# Altium footprint library 13-IC Packages-3pic1.PcbLib: 49 footprints (part 3 of 4)
Each footprint in its own frame and in the unit in brackets; x right, y up, seen from the top. Pads: shape width x height; smd on the part's side, far side on the other; paste and mask are expansions set on the pad; w line width, h text height; cw(c..) or ccw(c..) is an arc to the next point about the centre after c.
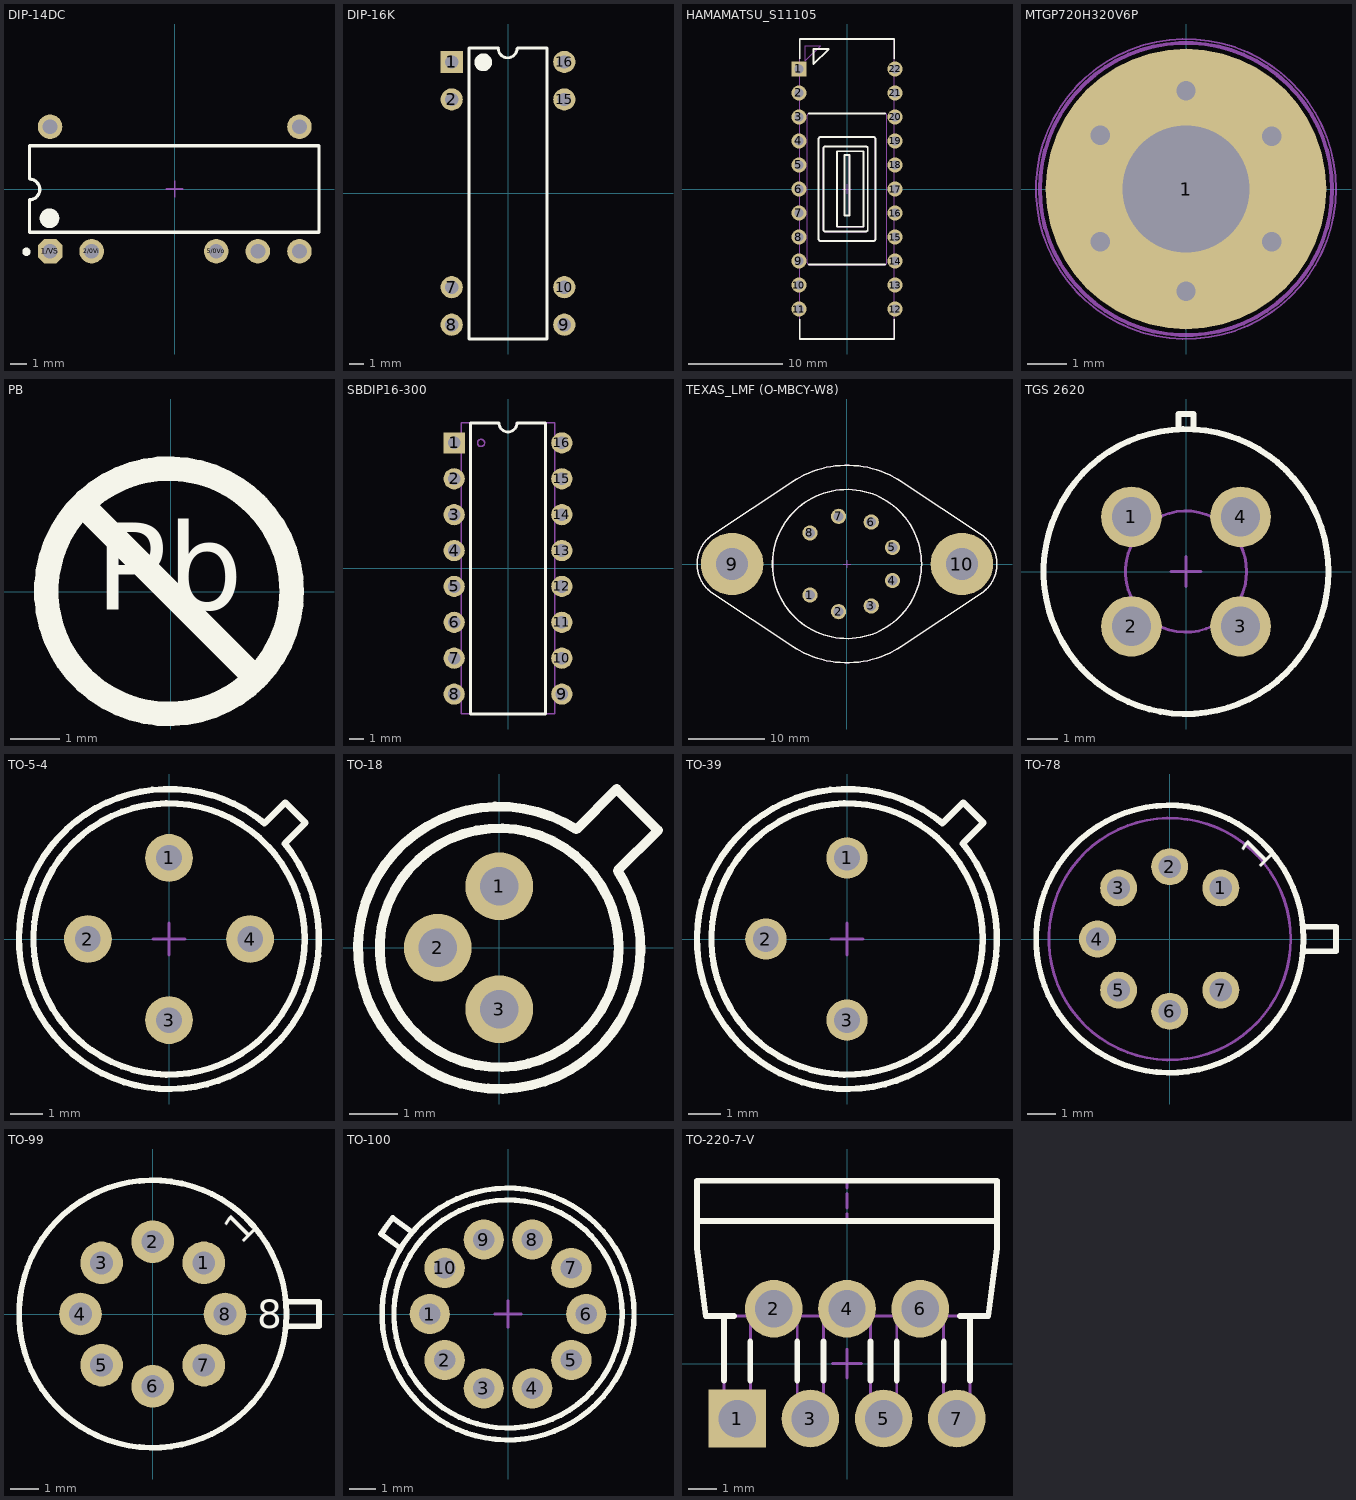
[diagram p2: the footprints below, top view; thin cyan lines are the x and y axes]

## DIP-14DC [mm]
height 5.08
pads (7):
  oct 1.5x1.5 hole 0.9 mask+0.07: 1/VS(-7.62,-3.81)
  round 1.5 hole 0.9: 2/0Vi(-5.08,-3.81)
  round 1.5 hole 0.9 mask+0.07: 5/0Vo(2.54,-3.81) 6/+Vout(5.08,-3.81) 7/-Vout/nc(7.62,-3.81) 8/SYNCout(7.62,3.81) 14/SYNCin(-7.62,3.81)
Top Overlay:
  circle w0.25: c-9.066,-3.835 r0.125
  circle w0.6: c-7.653,-1.791 r0.3
  lines w0.2: -8.881,-2.65 -8.881,-0.66 ccw(c-8.881,-0.025) -8.881,0.61 -8.881,2.625 -8.855,2.65 8.814,2.65 8.814,-2.65 -8.881,-2.65
Mechanical 15:
  lines w0.1: -0.5,0 0.5,0 ; 0,-0.5 0,0.5
3D body "dip-14K.stp": height 4.45, standoff -1.71, extent -8.661,-3.95 8.533,3.92
3D body "0_9-1_5-1_1.stp": height 0.05, standoff -1.05, extent -8.371,-4.572 -6.871,-3.072
3D body "0_9-1_5-1_1.stp": height 0.05, standoff -1.05, extent -5.831,-4.572 -4.331,-3.072
3D body "0_9-1_5-1_1.stp": height 0.05, standoff -1.05, extent 1.789,-4.572 3.289,-3.072
3D body "0_9-1_5-1_1.stp": height 0.05, standoff -1.05, extent 4.329,-4.572 5.829,-3.072
3D body "0_9-1_5-1_1.stp": height 0.05, standoff -1.05, extent 6.869,-4.572 8.369,-3.072
3D body "0_9-1_5-1_1.stp": height 0.05, standoff -1.05, extent 6.869,3.048 8.369,4.548
3D body "0_9-1_5-1_1.stp": height 0.05, standoff -1.05, extent -8.371,3.048 -6.871,4.548

## DIP-16K [mm]
height 5.08
pads (8):
  rect 1.5x1.5 hole 0.9: 1(-3.81,8.89)
  round 1.5 hole 0.9 mask+0.07: 2(-3.81,6.35) 7(-3.81,-6.35) 8(-3.81,-8.89) 9(3.81,-8.89) 10(3.81,-6.35) 15(3.81,6.35) 16(3.81,8.89)
Top Overlay:
  circle w0.6: c-1.672,8.865 r0.3
  lines w0.2: -0.66,9.804 ccw(c-0.025,9.804) 0.61,9.804 ; -0.635,9.83 -2.65,9.83 -2.65,-9.855 2.65,-9.855 2.65,9.83 0.635,9.83
3D body "dip-16K.stp": height 4.45, standoff -1.71, extent -3.935,-9.843 3.935,9.842
3D body "0_9-1_5-1_1.stp": height 0.05, standoff -1.05, extent -4.559,5.601 -3.059,7.101
3D body "0_9-1_5-1_1.stp": height 0.05, standoff -1.05, extent -4.572,8.141 -3.072,9.641
3D body "0_9-1_5-1_1.stp": height 0.05, standoff -1.05, extent -4.572,-7.099 -3.072,-5.599
3D body "0_9-1_5-1_1.stp": height 0.05, standoff -1.05, extent -4.572,-9.639 -3.072,-8.139
3D body "0_9-1_5-1_1.stp": height 0.05, standoff -1.05, extent 3.048,-9.639 4.548,-8.139
3D body "0_9-1_5-1_1.stp": height 0.05, standoff -1.05, extent 3.035,-7.099 4.535,-5.599
3D body "0_9-1_5-1_1.stp": height 0.05, standoff -1.05, extent 3.061,5.601 4.561,7.101
3D body "0_9-1_5-1_1.stp": height 0.05, standoff -1.05, extent 3.061,8.153 4.561,9.653

## HAMAMATSU_S11105 [mm] "22 Leads Dual In-Line Package, Row Spacing 10.16mm; Pitch 2.54mm"
height 4
pads (22):
  rect 1.6x1.6 hole 0.9: 1(-5.08,12.7)
  round 1.6 hole 0.9: 2(-5.08,10.16) 3(-5.08,7.62) 4(-5.08,5.08) 5(-5.08,2.54) 6(-5.08,0) 7(-5.08,-2.54) 8(-5.08,-5.08) 9(-5.08,-7.62) 10(-5.08,-10.16) 11(-5.08,-12.7) 12(5.08,-12.7) 13(5.08,-10.16) 14(5.08,-7.62) 15(5.08,-5.08) 16(5.08,-2.54) 17(5.08,0) 18(5.08,2.54) 19(5.08,5.08) 20(5.08,7.62) 21(5.08,10.16) 22(5.08,12.7)
Top Overlay:
  lines w0.2: -5,-13.797 -5,-15.875 5,-15.875 5,-13.797 ; -5,13.797 -5,15.875 5,15.875 5,13.797 ; -4.046,-7.995 ccw(c-4,-7.8) -4,-8 4,-8 ccw(c4,-7.8) 4.046,-7.995 ; -4.046,7.995 cw(c-4,7.8) -4,8 4,8 cw(c4,7.8) 4.046,7.995 ; -3.55,13.2 -3.55,14.8 -1.95,14.8 -3.55,13.2 ; -3,-5.3 ccw(c-2.8,-5.3) -2.8,-5.5 2.8,-5.5 ccw(c2.8,-5.3) 3,-5.3 3,5.3 ccw(c2.8,5.3) 2.8,5.5 -2.8,5.5 ccw(c-2.8,5.3) -3,5.3 -3,-5.3 ; -2.5,-4.3 ccw(c-2.3,-4.3) -2.3,-4.5 2,-4.5 ccw(c2,-4.3) 2.2,-4.3 2.2,4.3 ccw(c2,4.3) 2,4.5 -2.3,4.5 ccw(c-2.3,4.3) -2.5,4.3 -2.5,-4.3 ; -1.05,-4 -1.05,4 1.75,4 1.75,-4 -1.05,-4 ; -0.25,-2.8 -0.25,3.6 0.25,3.6 0.25,-2.8 -0.25,-2.8
Mechanical 8:
  lines w0.1: -5.58,-12.7 -5.08,-12.7 ; -5.58,-10.16 -5.08,-10.16 ; -5.58,-7.62 -5.08,-7.62 ; -5.58,-5.08 -5.08,-5.08 ; -5.58,-2.54 -5.08,-2.54 ; -5.58,0 -5.08,0 ; -5.58,2.54 -5.08,2.54 ; -5.58,5.08 -5.08,5.08 ; -5.58,7.62 -5.08,7.62 ; -5.58,10.16 -5.08,10.16 ; -5.58,12.7 -5.08,12.7 ; -5.08,-13.2 -5.08,-12.7 ; -5.08,-12.2 -5.08,-12.7 ; -5.08,-10.66 -5.08,-10.16 ; -5.08,-9.66 -5.08,-10.16 ; -5.08,-8.12 -5.08,-7.62 ; -5.08,-7.12 -5.08,-7.62 ; -5.08,-5.58 -5.08,-5.08 ; -5.08,-4.58 -5.08,-5.08 ; -5.08,-3.04 -5.08,-2.54 ; -5.08,-2.04 -5.08,-2.54 ; -5.08,-0.5 -5.08,0 ; -5.08,0.5 -5.08,0 ; -5.08,2.04 -5.08,2.54 ; -5.08,3.04 -5.08,2.54 ; -5.08,4.58 -5.08,5.08 ; -5.08,5.58 -5.08,5.08 ; -5.08,7.12 -5.08,7.62 ; -5.08,8.12 -5.08,7.62 ; -5.08,9.66 -5.08,10.16 ; -5.08,10.66 -5.08,10.16 ; -5.08,12.2 -5.08,12.7 ; -5.08,13.2 -5.08,12.7 ; -4.58,-12.7 -5.08,-12.7 ; -4.58,-10.16 -5.08,-10.16 ; -4.58,-7.62 -5.08,-7.62 ; -4.58,-5.08 -5.08,-5.08 ; -4.58,-2.54 -5.08,-2.54 ; -4.58,0 -5.08,0 ; -4.58,2.54 -5.08,2.54 ; -4.58,5.08 -5.08,5.08 ; -4.58,7.62 -5.08,7.62 ; -4.58,10.16 -5.08,10.16 ; -4.58,12.7 -5.08,12.7 ; -0.5,0 0,0 ; 0,-0.5 0,0 ; 0,0.5 0,0 ; 0.5,0 0,0 ; 4.58,-12.7 5.08,-12.7 ; 4.58,-10.16 5.08,-10.16 ; 4.58,-7.62 5.08,-7.62 ; 4.58,-5.08 5.08,-5.08 ; 4.58,-2.54 5.08,-2.54 ; 4.58,0 5.08,0 ; 4.58,2.54 5.08,2.54 ; 4.58,5.08 5.08,5.08 ; 4.58,7.62 5.08,7.62 ; 4.58,10.16 5.08,10.16 ; 4.58,12.7 5.08,12.7 ; 5.08,-13.2 5.08,-12.7 ; 5.08,-12.2 5.08,-12.7 ; 5.08,-10.66 5.08,-10.16 ; 5.08,-9.66 5.08,-10.16 ; 5.08,-8.12 5.08,-7.62 ; 5.08,-7.12 5.08,-7.62 ; 5.08,-5.58 5.08,-5.08 ; 5.08,-4.58 5.08,-5.08 ; 5.08,-3.04 5.08,-2.54 ; 5.08,-2.04 5.08,-2.54 ; 5.08,-0.5 5.08,0 ; 5.08,0.5 5.08,0 ; 5.08,2.04 5.08,2.54 ; 5.08,3.04 5.08,2.54 ; 5.08,4.58 5.08,5.08 ; 5.08,5.58 5.08,5.08 ; 5.08,7.12 5.08,7.62 ; 5.08,8.12 5.08,7.62 ; 5.08,9.66 5.08,10.16 ; 5.08,10.66 5.08,10.16 ; 5.08,12.2 5.08,12.7 ; 5.08,13.2 5.08,12.7 ; 5.58,-12.7 5.08,-12.7 ; 5.58,-10.16 5.08,-10.16 ; 5.58,-7.62 5.08,-7.62 ; 5.58,-5.08 5.08,-5.08 ; 5.58,-2.54 5.08,-2.54 ; 5.58,0 5.08,0 ; 5.58,2.54 5.08,2.54 ; 5.58,5.08 5.08,5.08 ; 5.58,7.62 5.08,7.62 ; 5.58,10.16 5.08,10.16 ; 5.58,12.7 5.08,12.7
Mechanical 14:
  lines w0.1: -5,-15.875 5,-15.875 5,15.875 -5,15.875 -5,-15.875 ; -4.4,13.575 -2.8,15.175 -4.4,15.175 -4.4,13.575 ; -4.2,-7.8 ccw(c-4,-7.8) -4,-8 4,-8 ccw(c4,-7.8) 4.2,-7.8 4.2,7.8 ccw(c4,7.8) 4,8 -4,8 ccw(c-4,7.8) -4.2,7.8 -4.2,-7.8 ; -3,-5.3 ccw(c-2.8,-5.3) -2.8,-5.5 2.8,-5.5 ccw(c2.8,-5.3) 3,-5.3 3,5.3 ccw(c2.8,5.3) 2.8,5.5 -2.8,5.5 ccw(c-2.8,5.3) -3,5.3 -3,-5.3 ; -2.5,-4.3 ccw(c-2.3,-4.3) -2.3,-4.5 2,-4.5 ccw(c2,-4.3) 2.2,-4.3 2.2,4.3 ccw(c2,4.3) 2,4.5 -2.3,4.5 ccw(c-2.3,4.3) -2.5,4.3 -2.5,-4.3 ; -1.05,-4 -1.05,4 1.75,4 1.75,-4 -1.05,-4 ; -0.25,-2.8 -0.25,3.6 0.25,3.6 0.25,-2.8 -0.25,-2.8
3D body "HAMAMATSU_S11105.stp": height 3, standoff -4.3, extent -5.205,-15.875 5.205,15.875

## MTGP720H320V6P [mm]
pads (1):
  round 7.2 hole 3.25: 1(0,0)
via -2.2,-1.35 diameter 1 hole 0.5
via -2.2,1.375 diameter 1 hole 0.5
via 0,2.525 diameter 1 hole 0.5
via 2.2,1.35 diameter 1 hole 0.5
via 0,-2.625 diameter 1 hole 0.5
via 2.2,-1.35 diameter 1 hole 0.5
Mechanical 8:
  circle w0.1: c0,0 r2.6
  circle w0.1: c0,0 r3.75
  lines w0.1: -2.657,1.625 -2.224,1.375 ; -2.632,-1.6 -2.199,-1.35 ; -2.474,0.942 -2.224,1.375 ; -2.449,-0.917 -2.199,-1.35 ; -1.974,1.808 -2.224,1.375 ; -1.949,-1.783 -2.199,-1.35 ; -1.791,1.125 -2.224,1.375 ; -1.766,-1.1 -2.199,-1.35 ; -0.5,-2.625 0,-2.625 ; -0.5,0 0,0 ; -0.5,2.525 0,2.525 ; 0,-3.125 0,-2.625 ; 0,-2.125 0,-2.625 ; 0,-0.5 0,0 ; 0,0.5 0,0 ; 0,2.025 0,2.525 ; 0,3.025 0,2.525 ; 0.5,-2.625 0,-2.625 ; 0.5,0 0,0 ; 0.5,2.525 0,2.525 ; 1.766,-1.1 2.199,-1.35 ; 1.766,1.1 2.199,1.35 ; 1.949,-1.783 2.199,-1.35 ; 1.949,1.783 2.199,1.35 ; 2.449,-0.917 2.199,-1.35 ; 2.449,0.917 2.199,1.35 ; 2.632,-1.6 2.199,-1.35 ; 2.632,1.6 2.199,1.35
Mechanical 14:
  circle w0.1: c0,0 r3.75
Mechanical 15:
  circle w0.05: c0,0 r3.85
3D body "mtgp720h320v6p.stp": height 0.1, standoff -1.75, extent -3.627,-3.627 3.628,3.628

## PB [mm]
Top Overlay:
  circle w0.5: c-0.031,0.013 r2.5
  lines w0.5: -1.737,1.719 1.675,-1.693
  text "Pb" at -1.536,-0.948 h3.05
3D body "pb.stp": height 0.02, standoff 0, extent -2.725,-2.725 2.725,2.725

## PCBComponent_1 - duplicate [mm]

## SBDIP16-300 [mm] "Side-Brazed Ceramic Dual In-Line Package (SBDIP) 16 Leads, Row Spacing 7.62 mm; Pitch 2.54 mm"
height 4.45
pads (16):
  rect 1.5x1.5 hole 0.9: 1(-3.81,8.89)
  round 1.5 hole 0.9: 2(-3.81,6.35) 3(-3.81,3.81) 4(-3.81,1.27) 5(-3.81,-1.27) 6(-3.81,-3.81) 7(-3.81,-6.35) 8(-3.81,-8.89) 9(3.81,-8.89) 10(3.81,-6.35) 11(3.81,-3.81) 12(3.81,-1.27) 13(3.81,1.27) 14(3.81,3.81) 15(3.81,6.35) 16(3.81,8.89)
Top Overlay:
  lines w0.2: -2.65,-10.3 -2.65,10.3 -0.635,10.3 ccw(c0,10.3) 0.635,10.3 2.65,10.3 2.65,-10.3 -2.65,-10.3
Mechanical 14:
  circle w0.1: c-1.905,8.89 r0.254
  lines w0.1: -3.3,-10.3 3.3,-10.3 3.3,10.3 0.6,10.3 cw(c-0.035,10.3) -0.67,10.3 -3.3,10.3 -3.3,-10.3
3D body "SBDIP16-300.stp": height 4.55, standoff -3.81, extent -4.125,-10.285 4.125,10.285

## TEXAS_LMF (O-MBCY-W8) [mm] "TO-3 8 Pins, Texas LMF (O-MBCY-W8) Case"
height 7.62
pads (10):
  round 2 hole 1.3: 1(-4.864,-4.082) 2(-1.103,-6.254) 3(3.175,-5.499) 4(5.967,-2.172) 5(5.967,2.172) 6(3.175,5.499) 7(-1.103,6.254) 8(-4.864,4.082)
  round 8.2 hole 4.2: 9(-15.075,0) 10(15.075,0)
Top Overlay:
  circle w0.2: c0,0 r9.78
  lines w0.2: -17.627,-3.839 cw(c-15.075,0) -17.627,3.839 -7.171,10.789 cw(c0,0) 7.171,10.789 17.627,3.839 cw(c15.075,0) 17.627,-3.839 7.171,-10.789 cw(c0,0) -7.171,-10.789 -17.627,-3.839
Mechanical 8:
  lines w0.1: -15.575,0 -15.075,0 ; -15.075,-0.5 -15.075,0 ; -15.075,0.5 -15.075,0 ; -14.575,0 -15.075,0 ; -5.247,-4.403 -4.864,-4.082 ; -5.247,4.403 -4.864,4.082 ; -5.186,-3.699 -4.864,-4.082 ; -5.186,3.699 -4.864,4.082 ; -4.543,-4.465 -4.864,-4.082 ; -4.543,4.465 -4.864,4.082 ; -4.481,-3.76 -4.864,-4.082 ; -4.481,3.76 -4.864,4.082 ; -1.595,-6.167 -1.103,-6.254 ; -1.595,6.167 -1.103,6.254 ; -1.189,-6.746 -1.103,-6.254 ; -1.189,6.746 -1.103,6.254 ; -1.016,-5.761 -1.103,-6.254 ; -1.016,5.761 -1.103,6.254 ; -0.61,-6.34 -1.103,-6.254 ; -0.61,6.34 -1.103,6.254 ; -0.5,0 0,0 ; 0,-0.5 0,0 ; 0,0.5 0,0 ; 0.5,0 0,0 ; 2.742,-5.749 3.175,-5.499 ; 2.742,5.749 3.175,5.499 ; 2.925,-5.066 3.175,-5.499 ; 2.925,5.066 3.175,5.499 ; 3.425,-5.932 3.175,-5.499 ; 3.425,5.932 3.175,5.499 ; 3.608,-5.249 3.175,-5.499 ; 3.608,5.249 3.175,5.499 ; 5.497,-2.001 5.967,-2.172 ; 5.497,2.001 5.967,2.172 ; 5.796,-2.642 5.967,-2.172 ; 5.796,2.642 5.967,2.172 ; 6.138,-1.702 5.967,-2.172 ; 6.138,1.702 5.967,2.172 ; 6.437,-2.343 5.967,-2.172 ; 6.437,2.343 5.967,2.172 ; 14.575,0 15.075,0 ; 15.075,-0.5 15.075,0 ; 15.075,0.5 15.075,0 ; 15.575,0 15.075,0
Mechanical 14:
  circle w0.1: c0,0 r9.78
  circle w0.1: c15.075,0 r1.95
  circle w0.1: c-15.075,0 r1.95
  lines w0.1: -17.627,-3.839 cw(c-15.075,0) -17.627,3.839 -7.171,10.789 cw(c0,0) 7.171,10.789 17.627,3.839 cw(c15.075,0) 17.627,-3.839 7.171,-10.789 cw(c0,0) -7.171,-10.789 -17.627,-3.839
3D body "TEXAS_LMF (O–MBCY–W8).stp": height 7.62, standoff -6, extent -19.685,-12.955 19.685,12.955

## TGS 2620 [mm] "4 Leads Solvent Vapors Sensor, Body Dia. 9.2mm, Body Height 7.8mm, Lead Spacing Diameter 5.1mm"
height 8.3
pads (4):
  round 2 hole 1.3: 1(-1.8,1.806) 2(-1.8,-1.806) 3(1.8,-1.806) 4(1.8,1.806)
Top Overlay:
  circle w0.2: c0,0 r4.7
  lines w0.2: -0.25,4.693 -0.25,5.2 0.25,5.2 0.25,4.693
Mechanical 8:
  lines w0.1: -2.3,-1.806 -1.8,-1.806 ; -2.3,1.806 -1.8,1.806 ; -1.8,-2.306 -1.8,-1.806 ; -1.8,-1.306 -1.8,-1.806 ; -1.8,1.306 -1.8,1.806 ; -1.8,2.306 -1.8,1.806 ; -1.3,-1.806 -1.8,-1.806 ; -1.3,1.806 -1.8,1.806 ; -0.5,0 0,0 ; 0,-0.5 0,0 ; 0,0.5 0,0 ; 0.5,0 0,0 ; 1.3,-1.806 1.8,-1.806 ; 1.3,1.806 1.8,1.806 ; 1.8,-2.306 1.8,-1.806 ; 1.8,-1.306 1.8,-1.806 ; 1.8,1.306 1.8,1.806 ; 1.8,2.306 1.8,1.806 ; 2.3,-1.806 1.8,-1.806 ; 2.3,1.806 1.8,1.806
Mechanical 14:
  circle w0.1: c0,0 r4.7
  circle w0.1: c0,0 r2
  lines w0.1: -0.25,4.693 -0.25,5.2 0.25,5.2 0.25,4.693
3D body "TGS 2620.stp": height 9.3, standoff -3.6, extent -4.7,-4.7 4.7,5.2

## TO-5-4 [mm] "TO-5, 4 Leads"
height 11.25
pads (4):
  round 1.5 hole 0.8: 1(0,2.54) 2(-2.54,0) 3(0,-2.54) 4(2.54,0)
Top Overlay:
  circle w0.2: c0,0 r4.25
  lines w0.2: 2.99,3.626 ccw(c0,0) 3.626,2.99 4.278,3.642 3.642,4.278 2.99,3.626
Mechanical 8:
  lines w0.1: -3.04,0 -2.54,0 ; -2.54,-0.5 -2.54,0 ; -2.54,0.5 -2.54,0 ; -2.04,0 -2.54,0 ; -0.5,-2.54 0,-2.54 ; -0.5,0 0,0 ; -0.5,2.54 0,2.54 ; 0,-3.04 0,-2.54 ; 0,-2.04 0,-2.54 ; 0,-0.5 0,0 ; 0,0.5 0,0 ; 0,2.04 0,2.54 ; 0,3.04 0,2.54 ; 0.5,-2.54 0,-2.54 ; 0.5,0 0,0 ; 0.5,2.54 0,2.54
Mechanical 14:
  circle w0.1: c0,0 r4.25
  lines w0.1: 2.99,3.626 ccw(c0,0) 3.626,2.99 4.278,3.642 3.642,4.278 2.99,3.626
3D body "TO-5-3.stp": height 11.25, standoff -3.65, extent -4.7,-4.7 4.7,4.7

## TO-18 [mm] "TO-18  3 Leads, Pitch 2.54mm, Body Dia. 5.84mm, Leads Dia. 0.5mm"
height 10.13
pads (3):
  round 1.4 hole 0.8: 1(0,1.27) 2(-1.27,0) 3(0,-1.27)
Top Overlay:
  circle w0.2: c0,0 r2.47
  lines w0.2: 1.593,2.447 ccw(c0,0) 2.447,1.593 3.282,2.428 2.428,3.282 1.593,2.447
Mechanical 14:
  circle w0.1: c0,0 r2.47
  lines w0.1: 1.593,2.447 ccw(c0,0) 2.447,1.593 3.282,2.428 2.428,3.282 1.593,2.447
3D body "TO-18.stp": height 10.13, standoff -3.6, extent -2.92,-2.92 3.282,3.282

## TO-39 [mm] "TO-39  3 Leads, Pitch 2.54mm, Body Dia. 9.4mm, Leads Dia. 0.5mm"
height 6.6
pads (3):
  round 1.3 hole 0.8: 1(0,2.54) 2(-2.54,0) 3(0,-2.54)
Top Overlay:
  circle w0.2: c0,0 r4.25
  lines w0.2: 2.99,3.626 ccw(c0,0) 3.626,2.99 4.278,3.642 3.642,4.278 2.99,3.626
Mechanical 8:
  lines w0.1: -3.04,0 -2.54,0 ; -2.54,-0.5 -2.54,0 ; -2.54,0.5 -2.54,0 ; -2.04,0 -2.54,0 ; -0.5,-2.54 0,-2.54 ; -0.5,0 0,0 ; -0.5,2.54 0,2.54 ; 0,-3.04 0,-2.54 ; 0,-2.04 0,-2.54 ; 0,-0.5 0,0 ; 0,0.5 0,0 ; 0,2.04 0,2.54 ; 0,3.04 0,2.54 ; 0.5,-2.54 0,-2.54 ; 0.5,0 0,0 ; 0.5,2.54 0,2.54
Mechanical 14:
  circle w0.1: c0,0 r4.25
  lines w0.1: 2.99,3.626 ccw(c0,0) 3.626,2.99 4.278,3.642 3.642,4.278 2.99,3.626
3D body "TO-39.stp": height 11.25, standoff -3.65, extent -4.7,-4.7 4.7,4.7

## TO-78 [mm] "TO-78 7 Leads, Body Dia. 9.4mm (max), Lead Diameter 5.08mm"
height 4.7
pads (7):
  round 1.3 hole 0.8: 1(1.796,1.796) 2(0,2.54) 3(-1.796,1.796) 4(-2.54,0) 5(-1.796,-1.796) 6(0,-2.54) 7(1.796,-1.796)
Top Overlay:
  circle w0.2: c0,0 r4.699
  lines w0.2: 4.679,-0.432 5.842,-0.432 5.842,0.432 4.679,0.432
  text "1" at 3.098,2.391 h1
Mechanical 8:
  text "2" at 0.5,3.667 h1
  text "3" at -2.239,2.946 h1
  text "4" at -3.643,0.5 h1
  text "5" at -2.946,-2.239 h1
  text "6" at -0.5,-3.69 h1
  text "7" at 2.239,-2.946 h1
Mechanical 14:
  circle w0.1: c0,0 r4.699
  circle w0.1: c0,0 r4.25
  lines w0.1: 4.679,-0.432 5.842,-0.432 5.842,0.432 4.679,0.432
  text "1" at 3.098,2.391 h1
3D body "TO-78.stp": height 4.7, standoff -3.6, extent -4.695,-4.695 5.835,4.695

## TO-99 [mm] "TO-99, 8 Leads, Body Dia. 9.4mm (max)"
height 5.72
pads (8):
  round 1.5 hole 0.8: 1(1.796,1.796) 2(0,2.54) 3(-1.796,1.796) 4(-2.54,0) 5(-1.796,-1.796) 6(0,-2.54) 7(1.796,-1.796) 8(2.54,0)
Top Overlay:
  circle w0.2: c0,0 r4.699
  lines w0.2: 4.679,-0.432 5.842,-0.432 5.842,0.432 4.679,0.432
  text "1" at 3.098,2.391 h1
  text "8" at 3.667,-0.5 h1
Mechanical 8:
  text "7" at 2.239,-2.946 h1
  text "6" at -0.5,-3.69 h1
  text "5" at -2.946,-2.239 h1
  text "4" at -3.643,0.5 h1
  text "3" at -2.239,2.946 h1
  text "2" at 0.5,3.667 h1
Mechanical 14:
  circle w0.1: c0,0 r4.699
  lines w0.1: 4.679,-0.432 5.842,-0.432 5.842,0.432 4.679,0.432
3D body "TO-99.stp": height 5.72, standoff -3.78, extent -4.7,-4.7 5.842,4.7

## TO-100 [mm] "TO-100, 10 Leads, Body Dia. 9.4mm (max)"
height 6.99
pads (10):
  round 1.5 hole 0.8: 1(-2.92,0) 2(-2.362,-1.716) 3(-0.902,-2.777) 4(0.902,-2.777) 5(2.362,-1.716) 6(2.92,0) 7(2.362,1.716) 8(0.902,2.777) 9(-0.902,2.777) 10(-2.362,1.716)
Top Overlay:
  circle w0.2: c0,0 r4.7
  circle w0.2: c0,0 r4.255
  lines w0.2: -4.747,2.985 -4.011,2.45 ; -4.737,2.978 cw(c0,0) -4.296,3.585 ; -4.306,3.592 -3.57,3.057
Mechanical 8:
  lines w0.1: -3.42,0 -2.92,0 ; -2.92,-0.5 -2.92,0 ; -2.92,0.5 -2.92,0 ; -2.767,-2.01 -2.362,-1.716 ; -2.767,2.01 -2.362,1.716 ; -2.656,-1.312 -2.362,-1.716 ; -2.656,1.312 -2.362,1.716 ; -2.42,0 -2.92,0 ; -2.068,-2.121 -2.362,-1.716 ; -2.068,2.121 -2.362,1.716 ; -1.958,-1.422 -2.362,-1.716 ; -1.958,1.422 -2.362,1.716 ; -1.378,-2.623 -0.902,-2.777 ; -1.378,2.623 -0.902,2.777 ; -1.057,-3.253 -0.902,-2.777 ; -1.057,3.253 -0.902,2.777 ; -0.748,-2.302 -0.902,-2.777 ; -0.748,2.302 -0.902,2.777 ; -0.5,0 0,0 ; -0.427,-2.932 -0.902,-2.777 ; -0.427,2.932 -0.902,2.777 ; 0,-0.5 0,0 ; 0,0.5 0,0 ; 0.427,-2.932 0.902,-2.777 ; 0.427,2.932 0.902,2.777 ; 0.5,0 0,0 ; 0.748,-2.302 0.902,-2.777 ; 0.748,2.302 0.902,2.777 ; 1.057,-3.253 0.902,-2.777 ; 1.057,3.253 0.902,2.777 ; 1.378,-2.623 0.902,-2.777 ; 1.378,2.623 0.902,2.777 ; 1.958,-1.422 2.362,-1.716 ; 1.958,1.422 2.362,1.716 ; 2.068,-2.121 2.362,-1.716 ; 2.068,2.121 2.362,1.716 ; 2.42,0 2.92,0 ; 2.656,-1.312 2.362,-1.716 ; 2.656,1.312 2.362,1.716 ; 2.767,-2.01 2.362,-1.716 ; 2.767,2.01 2.362,1.716 ; 2.92,-0.5 2.92,0 ; 2.92,0.5 2.92,0 ; 3.42,0 2.92,0
Mechanical 14:
  circle w0.1: c0,0 r4.7
  circle w0.1: c0,0 r4.255
  lines w0.1: -4.747,2.985 -4.011,2.45 cw(c0,0) -3.57,3.057 -4.306,3.592 ; -4.737,2.978 cw(c0,0) -4.296,3.585
3D body "TO-100.stp": height 5.97, standoff -3.6, extent -4.737,-4.7 4.7,4.7

## TO-220-7-V [mm] "TO-220 7 Leads - Vertical Mount"
height 21.37
pads (7):
  rect 2x2 hole 1.3: 1(-3.81,-1.905)
  round 2 hole 1.3: 2(-2.54,1.905) 3(-1.27,-1.905) 4(0,1.905) 5(1.27,-1.905) 6(2.54,1.905) 7(3.81,-1.905)
Top Overlay:
  lines w0.2: -5.205,4.95 5.205,4.95 ; -4.265,-0.581 -4.265,1.65 ; -3.917,1.65 -4.905,1.65 -5.205,4 -5.205,6.35 5.205,6.35 5.205,4 4.905,1.65 3.917,1.65 ; -3.355,-0.581 -3.355,0.767 ; -1.725,-0.581 -1.725,0.767 ; -0.815,-0.581 -0.815,0.767 ; 0.815,-0.581 0.815,0.767 ; 1.725,-0.581 1.725,0.767 ; 3.355,-0.581 3.355,0.767 ; 4.265,-0.581 4.265,1.65
Mechanical 8:
  lines w0.1: -4.31,-1.905 -3.81,-1.905 ; -3.81,-2.405 -3.81,-1.905 ; -3.81,-1.405 -3.81,-1.905 ; -3.31,-1.905 -3.81,-1.905 ; -3.04,1.905 -2.54,1.905 ; -2.54,1.405 -2.54,1.905 ; -2.54,2.405 -2.54,1.905 ; -2.04,1.905 -2.54,1.905 ; -1.77,-1.905 -1.27,-1.905 ; -1.27,-2.405 -1.27,-1.905 ; -1.27,-1.405 -1.27,-1.905 ; -0.77,-1.905 -1.27,-1.905 ; -0.5,0 0,0 ; -0.5,1.905 0,1.905 ; 0,-0.5 0,0 ; 0,0.5 0,0 ; 0,1.405 0,1.905 ; 0,2.405 0,1.905 ; 0,4.95 0,5.2 ; 0,5.4 0,5.65 0,5.9 ; 0,6.1 0,6.35 ; 0.5,0 0,0 ; 0.5,1.905 0,1.905 ; 0.77,-1.905 1.27,-1.905 ; 1.27,-2.405 1.27,-1.905 ; 1.27,-1.405 1.27,-1.905 ; 1.77,-1.905 1.27,-1.905 ; 2.04,1.905 2.54,1.905 ; 2.54,1.405 2.54,1.905 ; 2.54,2.405 2.54,1.905 ; 3.04,1.905 2.54,1.905 ; 3.31,-1.905 3.81,-1.905 ; 3.81,-2.405 3.81,-1.905 ; 3.81,-1.405 3.81,-1.905 ; 4.31,-1.905 3.81,-1.905
Mechanical 14:
  lines w0.1: -5.205,4.95 5.205,4.95 ; -4.265,1.65 -4.265,-2.23 -3.355,-2.23 -3.355,1.65 ; -2.995,1.65 -2.995,1.58 -2.085,1.58 -2.085,1.65 ; -1.725,1.65 -1.725,-2.23 -0.815,-2.23 -0.815,1.65 ; -0.455,1.65 -0.455,1.58 0.455,1.58 0.455,1.65 ; 0.815,1.65 0.815,-2.23 1.725,-2.23 1.725,1.65 ; 2.085,1.65 2.085,1.58 2.995,1.58 2.995,1.65 ; 3.355,1.65 3.355,-2.23 4.265,-2.23 4.265,1.65 ; -5.205,4 -4.905,1.65 4.905,1.65 5.205,4 5.205,6.35 -5.205,6.35 -5.205,4
3D body "TO-220-7-V.stp": height 21.74, standoff -3.8, extent -5.205,-2.23 5.205,6.35